# Altium footprint library Connectors.PcbLib: 155 footprints (part 1 of 10)
Each footprint in its own frame and in the unit in brackets; x right, y up, seen from the top. Pads: shape width x height; smd on the part's side, far side on the other; paste and mask are expansions set on the pad; w line width, h text height; cw(c..) or ccw(c..) is an arc to the next point about the centre after c.
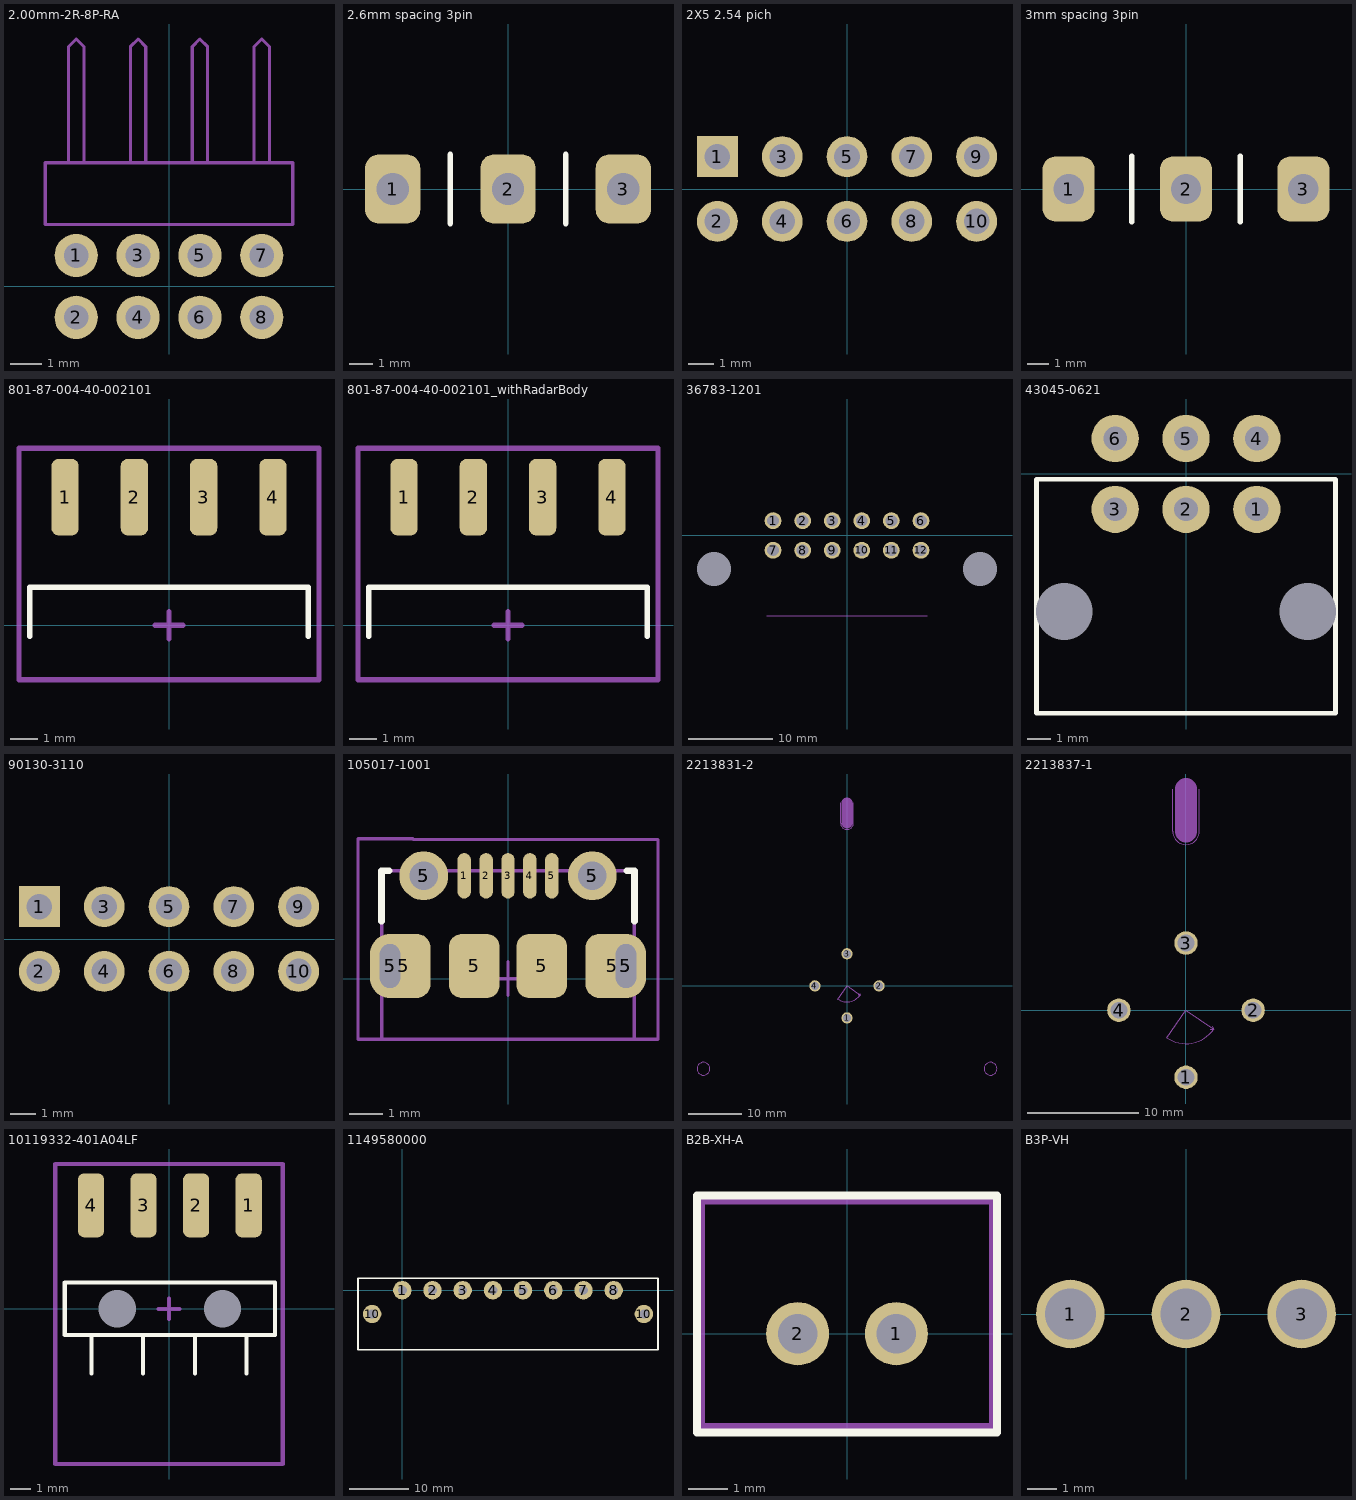
[diagram p0: the footprints below, top view; thin cyan lines are the x and y axes]

## 2.00mm-2R-8P-RA [mm]
pads (8):
  round 1.4 hole 0.8: 1(-3,1) 2(-3,-1) 3(-1,1) 4(-1,-1) 5(1,1) 6(1,-1) 7(3,1) 8(3,-1)
Mechanical 13:
  lines w0.102: -3.25,4 -3.25,7.75 ; -2.75,4 -2.75,7.75 -3,8 -3.25,7.75 ; -1.25,4 -1.25,7.75 ; -0.75,4 -0.75,7.75 -1,8 -1.25,7.75 ; 0.75,4 0.75,7.75 ; 1.25,4 1.25,7.75 1,8 0.75,7.75 ; 2.75,4 2.75,7.75 ; 3.25,4 3.25,7.75 3,8 2.75,7.75 ; -3.25,7.75 -3.25,7.75 ; -1.25,7.75 -1.25,7.75 ; 0.75,7.75 0.75,7.75 ; 2.75,7.75 2.75,7.75 ; -4,2 4,2 4,4 -4,4 -4,2
3D body: height 4, standoff -2.8, extent -3.95,-1.25 3.975,8

## 2.6mm spacing 3pin [mm] "Terminal Block 5mm 3 position"
pads (3):
  rrect50% 2.4x3 hole 1.4: 1(-5,0) 2(0,0) 3(5,0)
Top Overlay:
  lines w0.254: -2.5,-1.5 -2.5,1.5 ; 2.5,-1.5 2.5,0 2.5,1.5

## 2X5 2.54 pich [mm] "2X5 2.54 pich"
height 9.75
pads (10):
  rect 1.6x1.6 hole 1: 1(-5.08,1.27)
  round 1.6 hole 1: 2(-5.08,-1.27) 3(-2.54,1.27) 4(-2.54,-1.27) 5(0,1.27) 6(0,-1.27) 7(2.54,1.27) 8(2.54,-1.27) 9(5.08,1.27) 10(5.08,-1.27)

## 3mm spacing 3pin [mm] "Terminal Block 5.4mm 3 position"
pads (3):
  rrect50% 2.4x3 hole 1.4: 1(-5.4,0) 2(0,0) 3(5.4,0)
Top Overlay:
  lines w0.254: -2.5,-1.5 -2.5,1.5 ; 2.5,-1.5 2.5,0 2.5,1.5

## 801-87-004-40-002101 [mm] "Preci-Dip 801-87-004-40-002101"
height 2.54
pads (4):
  rrect50% 1x2.8 smd: 1(-3.81,4.7) 2(-1.27,4.7) 3(1.27,4.7) 4(3.81,4.7)
Top Overlay:
  lines w0.2: -5.1,-0.4 -5.1,1.4 5.1,1.4 5.1,-0.4
Mechanical 15:
  lines w0.2: -0.5,0 0.5,0 ; 0,-0.5 0,0.5 ; -5.5,-2 5.5,-2 5.5,6.5 -5.5,6.5 -5.5,-2
3D body: height 2.54, standoff 0, extent -5.08,-1.394 5.08,5.49

## 801-87-004-40-002101_withRadarBody [mm] "Preci-Dip 801-87-004-40-002101 with radar body model"
height 2.54
pads (4):
  rrect50% 1x2.8 smd: 1(-3.81,4.7) 2(-1.27,4.7) 3(1.27,4.7) 4(3.81,4.7)
Top Overlay:
  lines w0.2: -5.1,-0.4 -5.1,1.4 5.1,1.4 5.1,-0.4
Mechanical 15:
  lines w0.2: -0.5,0 0.5,0 ; 0,-0.5 0,0.5 ; -5.5,-2 5.5,-2 5.5,6.5 -5.5,6.5 -5.5,-2
3D body: height 2.87, standoff -22.13, extent -7.45,-11.098 17.55,2.364
3D body: height 2.54, standoff 0, extent -5.08,-1.394 5.08,5.49

## 36783-1201 [mm] "Molex MX120G Waterproof 12-pin connector"
height 22.9
pads (14):
  round 0 hole 4 unplated: 0(-15.75,-3.95) 0(15.75,-3.95)
  round 2 hole 1.4: 1(-8.75,1.75) 2(-5.25,1.75) 3(-1.75,1.75) 4(1.75,1.75) 5(5.25,1.75) 6(8.75,1.75) 7(-8.75,-1.75) 8(-5.25,-1.75) 9(-1.75,-1.75) 10(1.75,-1.75) 11(5.25,-1.75) 12(8.75,-1.75)
Mechanical 13:
  lines w0.1: -9.5,-9.5 9.5,-9.5
  text "PCB edge" at -4,-11 h1
3D body: height 24.58, standoff -3.04, extent -18.679,-30.408 18.679,2.05

## 43045-0621 [mm] "molex connector"
pads (8):
  round 0 hole 2.4: 0(-5.15,-5.825) 0(5.15,-5.825)
  round 2 hole 1: 1(3,-1.5) 2(0,-1.5) 3(-3,-1.5) 4(3,1.5) 5(0,1.5) 6(-3,1.5)
Top Overlay:
  lines w0.2: -6.325,-10.125 -6.325,-0.225 6.325,-0.225 6.325,-2.225 6.325,-10.125 -0.475,-10.125 -6.325,-10.125
3D body: height 8.83, standoff -3.12, extent -6.6,-10.4 6.6,1.84

## 90130-3110 [mm] "90130-3110"
height 9.75
pads (10):
  rect 1.6x1.6 hole 1: 1(-5.08,1.27)
  round 1.6 hole 1: 2(-5.08,-1.27) 3(-2.54,1.27) 4(-2.54,-1.27) 5(0,1.27) 6(0,-1.27) 7(2.54,1.27) 8(2.54,-1.27) 9(5.08,1.27) 10(5.08,-1.27)
3D body: height 9.77, standoff -2.88, extent -7.54,-11.801 7.5,1.601

## 105017-1001 [mm] "Micro USB connector, no lips"
height 2.45
pads (17):
  oval 0.4x1.35 smd: 1(-1.3,3.05) 2(-0.65,3.05) 3(0,3.05) 4(0.65,3.05) 5(1.3,3.05)
  oval 1.2x1.9 hole 0.6 slot 1.3 at 90 deg: 5(-3.5,0.375) 5(3.5,0.375)
  oval 1.2x1.9 on Top Paste: 5(-3.5,0.375) 5(3.5,0.375)
  rrect50% 1.6x1.9 smd: 5(-3.1,0.375) 5(3.1,0.375)
  round 1.45 hole 0.85: 5(-2.5,3.05) 5(2.5,3.05)
  round 1.45 on Top Paste: 5(-2.5,3.05) 5(2.5,3.05)
  rrect50% 1.5x1.9 smd: 5(-1,0.375) 5(1,0.375)
Top Overlay:
  lines w0.2: -3.75,1.7 -3.75,3.2 -3.525,3.2 ; 3.525,3.2 3.75,3.2 3.75,1.7
Mechanical 13:
  lines w0.1: -3.75,-1.8 -3.75,3.2 3.75,3.2 3.75,-1.8 -3.75,-1.8
Mechanical 15:
  lines w0.1: -0.5,0 0.5,0 ; 0,-0.5 0,0.5 ; -4.45,-1.8 -3.75,-1.8 4.45,-1.8 4.45,3 4.45,4.125 -2.8,4.125 -2.825,4.15 -4.45,4.15 -4.45,-0.05 -4.45,-1.8
3D body: height 2.68, standoff -0.63, extent -3.75,-1.8 3.75,3.2

## 2213831-2 [mm] "TE Connectivity Zhaga 80mm Vented"
pads (4):
  round 2.1 hole 1.5: 1(0,-6) 2(6,0) 3(0,6) 4(-6,0)
Mechanical 13:
  circle w0.1: c26.85,-15.5 r1.2
  circle w0.1: c-26.85,-15.5 r1.2
  lines w0.1: -1.2,34.225 -1.2,30.45 ccw(c0,30.45) 0,29.25 ccw(c0,30.45) 1.2,30.45 1.2,34.225 ; 2.15,-1.7 2.463,-1.712 ; 2.35,-1.45 2.463,-1.712 ; 2.463,-1.712 cw(c0,0) -1.712,-2.463 0,0 2.463,-1.712
  lines w2: 0,30.45 0,34.225
  text "Y-axis - perpendicular to street" at 0.225,0.175 h0.5
  text "X-axis - parallel to street" at -2.825,-3.575 h0.5
3D body: height 1.5, standoff -15.55, extent -37.559,-37.6 37.559,36.626

## 2213837-1 [mm] "TE Connectivity Zhaga 40mm"
pads (4):
  round 2.1 hole 1.5: 1(0,-6) 2(6,0) 3(0,6) 4(-6,0)
Mechanical 13:
  lines w0.1: -1.2,19.775 -1.2,16 ccw(c0,16) 0,14.8 ccw(c0,16) 1.2,16 1.2,19.775 ; 2.15,-1.7 2.463,-1.712 ; 2.35,-1.45 2.463,-1.712 ; 2.463,-1.712 cw(c0,0) -1.712,-2.463 0,0 2.463,-1.712
  lines w2: 0,16 0,19.775
  text "X-axis - parallel to street" at -2.825,-3.575 h0.5
  text "Y-axis - perpendicular to street" at 0.225,0.175 h0.5
3D body: height 1.5, standoff -15.55, extent -21.679,-21.75 21.679,20.8

## 10119332-401A04LF [mm] "HEADER SMD R/A 4POS 2.54MM with Board Guide"
height 3.8
pads (6):
  round 0 hole 1.8 unplated: 0(-2.5,0) 0(2.58,0)
  rrect50% 1.27x3.1 smd: 1(3.85,5) 2(1.31,5) 3(-1.23,5) 4(-3.77,5)
Top Overlay:
  lines w0.2: -3.75,-3.125 -3.75,-1.27 ; -1.25,-3.125 -1.25,-1.27 ; 1.25,-3.125 1.25,-1.27 ; 3.75,-3.125 3.75,-1.27 ; -5.04,-1.27 5.12,-1.27 5.12,1.27 -5.04,1.27 -5.04,-1.27
Mechanical 15:
  lines w0.2: -0.5,0 0.5,0 ; 0,-0.5 0,0.5 ; -5.5,-7.5 5.5,-7.5 5.5,7 -5.5,7 -5.5,-7.5
3D body: height 3.17, standoff -1.4, extent -5.04,-7.112 5.12,5.842

## 1149580000 [mm] "1149580000 Weidmuller"
pads (10):
  round 3.1 hole 1.5: 1(0,0) 2(5.08,0) 3(10.16,0) 4(15.24,0) 5(20.32,0) 6(25.4,0) 7(30.48,0) 8(35.56,0) 10(-5.08,-4) 10(40.64,-4)
Top Overlay:
  lines w0.3: -7.46,-10 -7.46,2 43.02,2 43.02,-10 40.64,-10 -5.08,-10 -7.46,-10
3D body: height 8.43, standoff -3.2, extent -7.54,-10 43.1,2

## B2B-XH-A [mm] "B2B-XH-A, JST XH, 2 pins"
height 7
pads (2):
  round 1.6 hole 1: 1(1.25,0) 2(-1.25,0)
Top Overlay:
  lines w0.2: -3.8,-2.5 3.8,-2.5 3.8,3.5 -3.8,3.5 -3.8,-2.5
Mechanical 13:
  lines w0.2: -3.696,-2.365 3.696,-2.365 3.696,3.375 -3.696,3.375 -3.696,-2.366
3D body: height 7.11, standoff -3.81, extent -3.696,-2.365 3.696,3.375

## B3P-VH [mm] "Mating for battery connector VH3.96, Japan Solderless Terminals"
pads (3):
  round 2.35 hole 1.75: 1(-3.96,0) 2(0,0) 3(3.96,0)
3D body: height 10.9, standoff -3.7, extent -5.91,-4.6 5.91,3.9